# Altium integrated library BYTECH_HW_LIB_2019.IntLib: 907 symbols (part 2 of 6) (continued)
## Quectel M66 (continued)
text: M66 OPEN CPU

## Quectel M66_R2
designator U?, comment M66_R2
GSM MODULE OPEN CPU; MFR: Quectel; Solder: SMT; MPN: M66_R2; Value: M66_R2; Category: MODULE
footprint M66
pins: 1 AGND (power), 2 SPK2P, 3 MICP, 4 MICN, 5 SPK1P, 6 SPK1N, 7 PWRKEY, 8 AVDD, 9 ADC0, 10 SIM_GND (power), 11 SIM_DATA (io), 12 SIM_RST (out), 13 SIM_CLK (out), 14 SIM_VDD (out), 15 RFU, 16 NETLIGHT/GPIO/PWM, 17 TXD (out), 18 RXD (in), 19 DTR/GPIO/EINT, 20 RI/GPIO/I2C_SCL, 21 DCD/GPIO/I2C_SDA, 22 CTS/GPIO, 23 RTS/GPIO, 24 VDD_EXT (out), 25 RFTXMON, 26 RFU, 27 GND, 28 RXD_AUX/GPIO, 29 TXD_AUX/GPIO, 30 PCM_CLK/GPIO/SPI_CS, 31 PCM_SYNC/GPIO/SPI_MISO, 32 PCM_IN/GPIOSPI_CLK, 33 PCM_OUT/GPIO/SPI_MOSI, 34 GND, 35 RF_ANT (io), 36 GND (power), 37 GND (power), 38 DBG_RXD (in), 39 DBG_TXD (out), 40 GND (power), 41 GND (power), 42 VBAT (in), 43 VBAT (in), 44 VRTC (io)
text: M66 OPEN CPU

## Quectel M95FA
designator U?, comment M95FA
Quectel GSM & GPRS Module; Solder: SMT; MPN: M95FA; Value: M95FA; Category: MODULE
footprint M95FA
pins: 1 AGND (power), 2 MIC2P (in), 3 MIC2N (in), 4 MIC1P (in), 5 MIC1N (in), 6 SPK1N (out), 7 SPK1P (out), 8 LOUDSPKN (out), 9 LOUDSPKP (out), 10 PWRKEY (in), 11 EMERG_OFF (in), 12 STATUS (out), 13 NETLIGHT (out), 14 DBG_RXD (in), 15 DBG_TXD (out), 19 VDD_EXT (out), 20 DTR (in), 21 RXD (in), 22 TXD (out), 23 CTS (out), 24 RTS (in), 25 DCD (out), 26 RI (in), 27 SIM_VDD (out), 28 SIM_RST (out), 29 SIM_DATA (io), 30 SIM_CLK (out), 31 SIM_GND (power), 32 VRTC (io), 33 VBAT (in), 34 VBAT (in), 35 GND (power), 36 GND (power), 37 GND (power), 38 GND (power), 39 RF_ANT (io), 40 GND (power), 41 RESERVED (io) hidden, 42 RESERVED (io) hidden
text: M95 - Quectel; GSM/GPRS MODULE

## Quectel MC60
designator U?, comment MC60
GSM GNSS Module; Solder: SMT; MPN: MC60; Value: MC60; Category: MODULE
footprint MC60
pins: 1 MICP, 2 MICN, 3 SPKP, 4 SPKN, 5 PWRKEY (in), 6 ADC (in), 7 SD_CMD/GPIO (io), 8 SD_CLK/GPIO (io), 9 SD_DATA/GPIO (io), 10 SIM2_CLK/GPIO (out), 11 SIM2_DATA/GPIO (io), 12 SIM2_RST/GPIO (out), 13 SIM2_VDD (power), 14 GND (power), 15 GNSS_ANT, 16 SIM_GND (power), 18 SIM1_VDD (power), 19 SIM1_CLK (out), 20 SIM1_RST (out), 21 SIM1_DATA (io), 22 GNSS_TXD (out), 23 GNSS_RXD (in), 24 RXD_AUX (in), 25 TXD_AUX (out), 26 GNSS_VCC (power), 27 GND (power), 28 GNSS_VCC_EN (out), 29 DBG_TXD (out), 30 DBG_RXD (in), 31 GND (power), 32 BT_ANT, 33 TXD (out), 34 RXD (in), 35 RI/I2C_SCL (io), 36 DCD/I2C_SDA (io), 37 DTR/GPIO/EINT (io), 38 CTS/GPIO/EINT (io), 39 RTS/GPIO (io), 40 GND (power), 41 RF_ANT, 42 GND (power), 43 VDD_EXT, 44 GND (power), 45 GND (power), 47 NETLIGHT/GPIO (io), 48 GND (power), 49 GND (power), 50 VBAT (power), 51 VBAT (power), 52 VRTC (power), 53 LOUDSPKN, 54 LOUDSPKP, 59 PCM_CLK/SPI_CS (io), 60 PCM_OUT/SPI_MOSI (io), 61 PCM_SYNC/SPI_MISO (io), 62 PCM_IN/SPI_CLK (io)

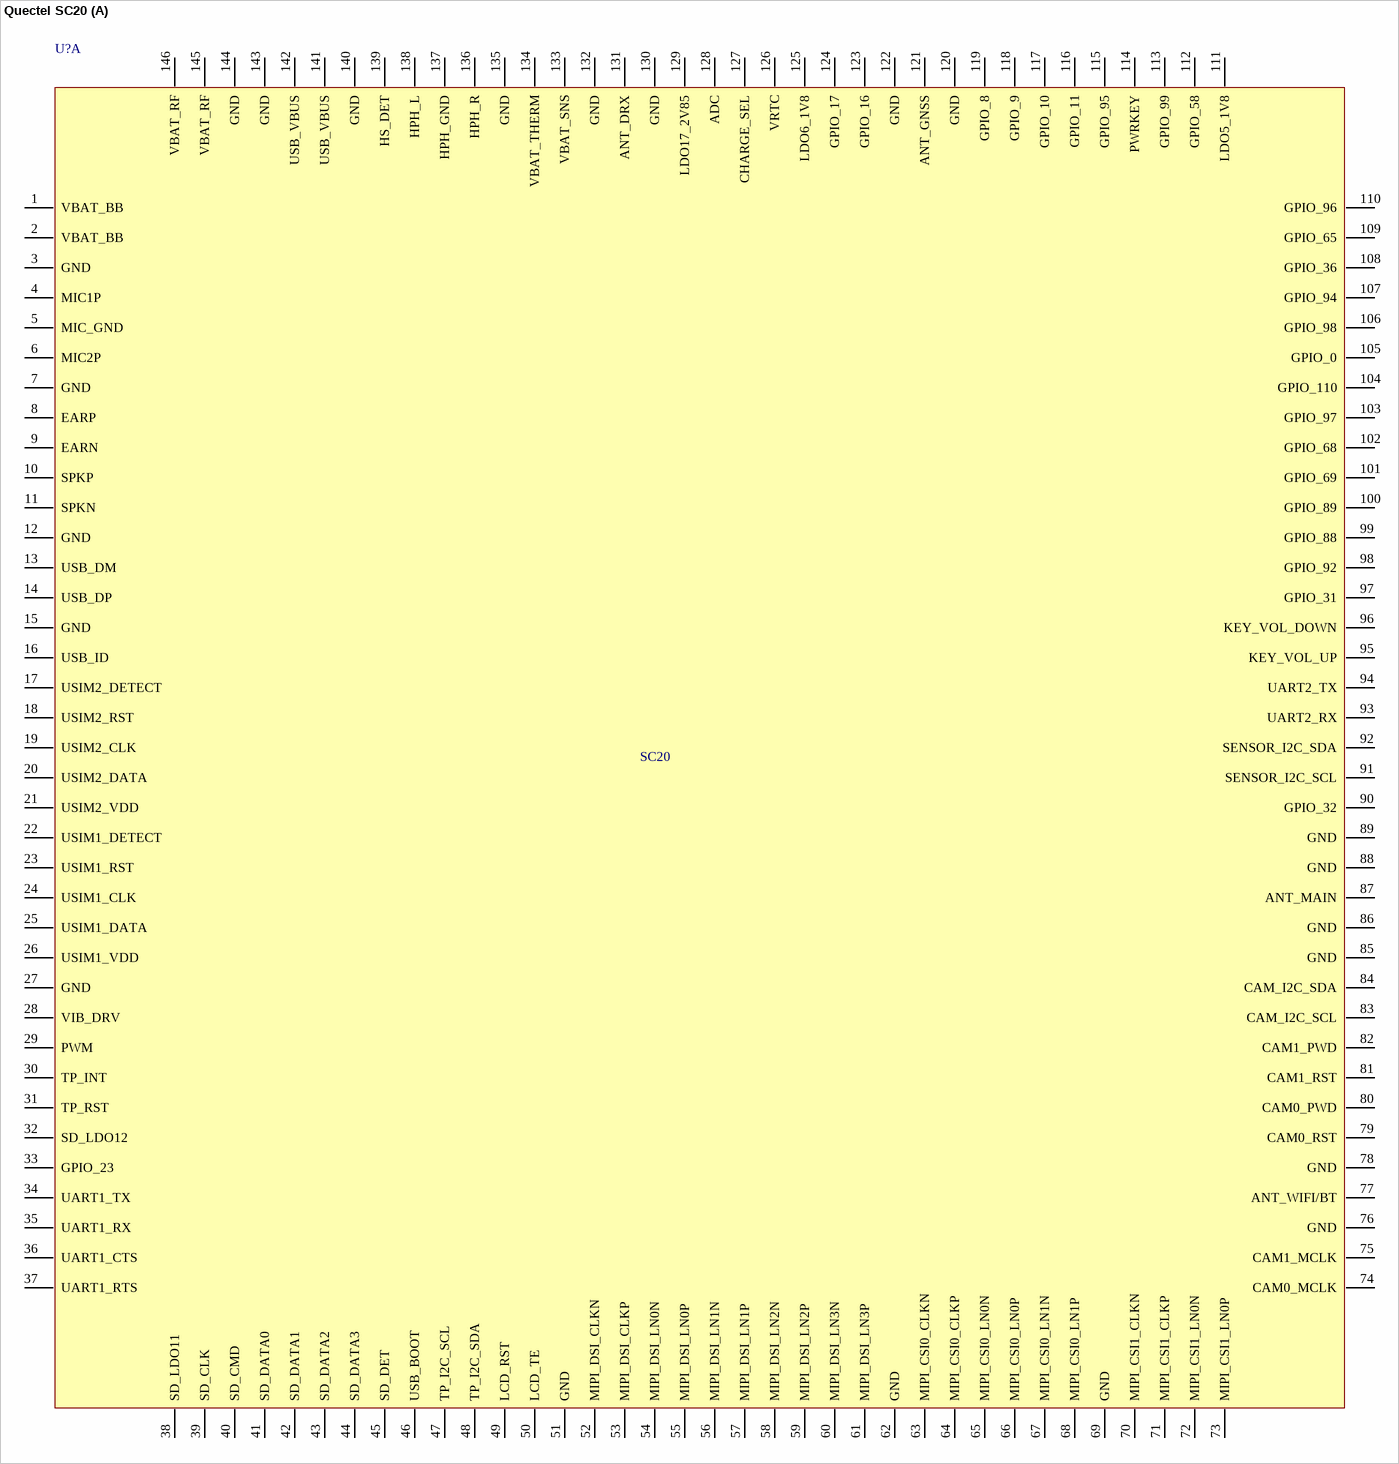
[diagram p10: symbol Quectel SC20]

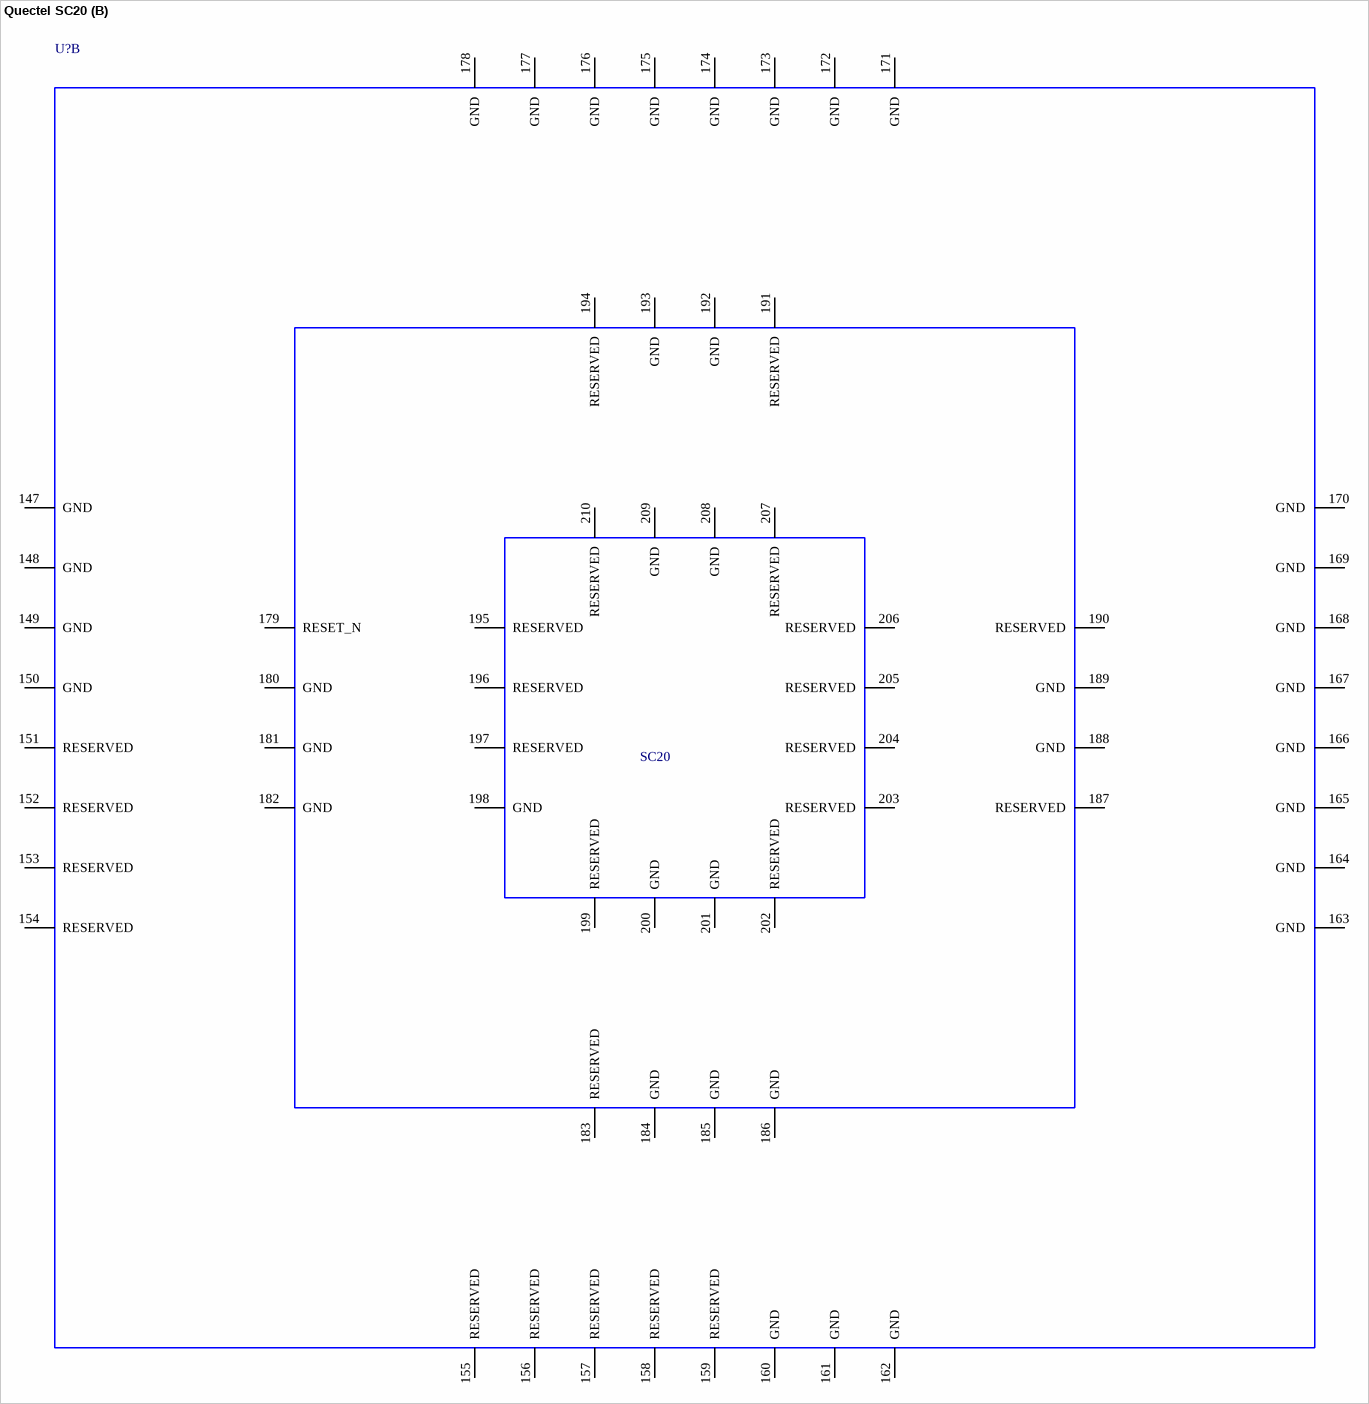
[diagram p11: symbol Quectel SC20]

## Quectel SC20
designator U?, comment SC20
Value: SC20A; Solder: SMT; MPN: SC20A; Category: MODULE
part A pins: 1 VBAT_BB, 2 VBAT_BB, 3 GND, 4 MIC1P, 5 MIC_GND, 6 MIC2P, 7 GND, 8 EARP, 9 EARN, 10 SPKP, 11 SPKN, 12 GND, 13 USB_DM, 14 USB_DP, 15 GND, 16 USB_ID, 17 USIM2_DETECT, 18 USIM2_RST, 19 USIM2_CLK, 20 USIM2_DATA, 21 USIM2_VDD, 22 USIM1_DETECT, 23 USIM1_RST, 24 USIM1_CLK, 25 USIM1_DATA, 26 USIM1_VDD, 27 GND, 28 VIB_DRV, 29 PWM, 30 TP_INT, 31 TP_RST, 32 SD_LDO12, 33 GPIO_23, 34 UART1_TX, 35 UART1_RX, 36 UART1_CTS, 37 UART1_RTS, 38 SD_LDO11, 39 SD_CLK, 40 SD_CMD, 41 SD_DATA0, 42 SD_DATA1, 43 SD_DATA2, 44 SD_DATA3, 45 SD_DET, 46 USB_BOOT, 47 TP_I2C_SCL, 48 TP_I2C_SDA, 49 LCD_RST, 50 LCD_TE, 51 GND, 52 MIPI_DSI_CLKN, 53 MIPI_DSI_CLKP, 54 MIPI_DSI_LN0N, 55 MIPI_DSI_LN0P, 56 MIPI_DSI_LN1N, 57 MIPI_DSI_LN1P, 58 MIPI_DSI_LN2N, 59 MIPI_DSI_LN2P, 60 MIPI_DSI_LN3N, 61 MIPI_DSI_LN3P, 62 GND, 63 MIPI_CSI0_CLKN, 64 MIPI_CSI0_CLKP, 65 MIPI_CSI0_LN0N, 66 MIPI_CSI0_LN0P, 67 MIPI_CSI0_LN1N, 68 MIPI_CSI0_LN1P, 69 GND, 70 MIPI_CSI1_CLKN, 71 MIPI_CSI1_CLKP, 72 MIPI_CSI1_LN0N, 73 MIPI_CSI1_LN0P, 74 CAM0_MCLK, 75 CAM1_MCLK, 76 GND, 77 ANT_WIFI/BT, 78 GND, 79 CAM0_RST, 80 CAM0_PWD, 81 CAM1_RST, 82 CAM1_PWD, 83 CAM_I2C_SCL, 84 CAM_I2C_SDA, 85 GND, 86 GND, 87 ANT_MAIN, 88 GND, 89 GND, 90 GPIO_32, 91 SENSOR_I2C_SCL, 92 SENSOR_I2C_SDA, 93 UART2_RX, 94 UART2_TX, 95 KEY_VOL_UP, 96 KEY_VOL_DOWN, 97 GPIO_31, 98 GPIO_92, 99 GPIO_88, 100 GPIO_89, 101 GPIO_69, 102 GPIO_68, 103 GPIO_97, 104 GPIO_110, 105 GPIO_0, 106 GPIO_98, 107 GPIO_94, 108 GPIO_36, 109 GPIO_65, 110 GPIO_96, 111 LDO5_1V8, 112 GPIO_58, 113 GPIO_99, 114 PWRKEY, 115 GPIO_95, 116 GPIO_11, 117 GPIO_10, 118 GPIO_9, 119 GPIO_8, 120 GND, 121 ANT_GNSS, 122 GND, 123 GPIO_16, 124 GPIO_17, 125 LDO6_1V8, 126 VRTC, 127 CHARGE_SEL, 128 ADC, 129 LDO17_2V85, 130 GND, 131 ANT_DRX, 132 GND, 133 VBAT_SNS, 134 VBAT_THERM, 135 GND, 136 HPH_R, 137 HPH_GND, 138 HPH_L, 139 HS_DET, 140 GND, 141 USB_VBUS, 142 USB_VBUS, 143 GND, 144 GND, 145 VBAT_RF, 146 VBAT_RF
part B pins: 147 GND, 148 GND, 149 GND, 150 GND, 151 RESERVED, 152 RESERVED, 153 RESERVED, 154 RESERVED, 155 RESERVED, 156 RESERVED, 157 RESERVED, 158 RESERVED, 159 RESERVED, 160 GND, 161 GND, 162 GND, 163 GND, 164 GND, 165 GND, 166 GND, 167 GND, 168 GND, 169 GND, 170 GND, 171 GND, 172 GND, 173 GND, 174 GND, 175 GND, 176 GND, 177 GND, 178 GND, 179 RESET_N, 180 GND, 181 GND, 182 GND, 183 RESERVED, 184 GND, 185 GND, 186 GND, 187 RESERVED, 188 GND, 189 GND, 190 RESERVED, 191 RESERVED, 192 GND, 193 GND, 194 RESERVED, 195 RESERVED, 196 RESERVED, 197 RESERVED, 198 GND, 199 RESERVED, 200 GND, 201 GND, 202 RESERVED, 203 RESERVED, 204 RESERVED, 205 RESERVED, 206 RESERVED, 207 RESERVED, 208 GND, 209 GND, 210 RESERVED

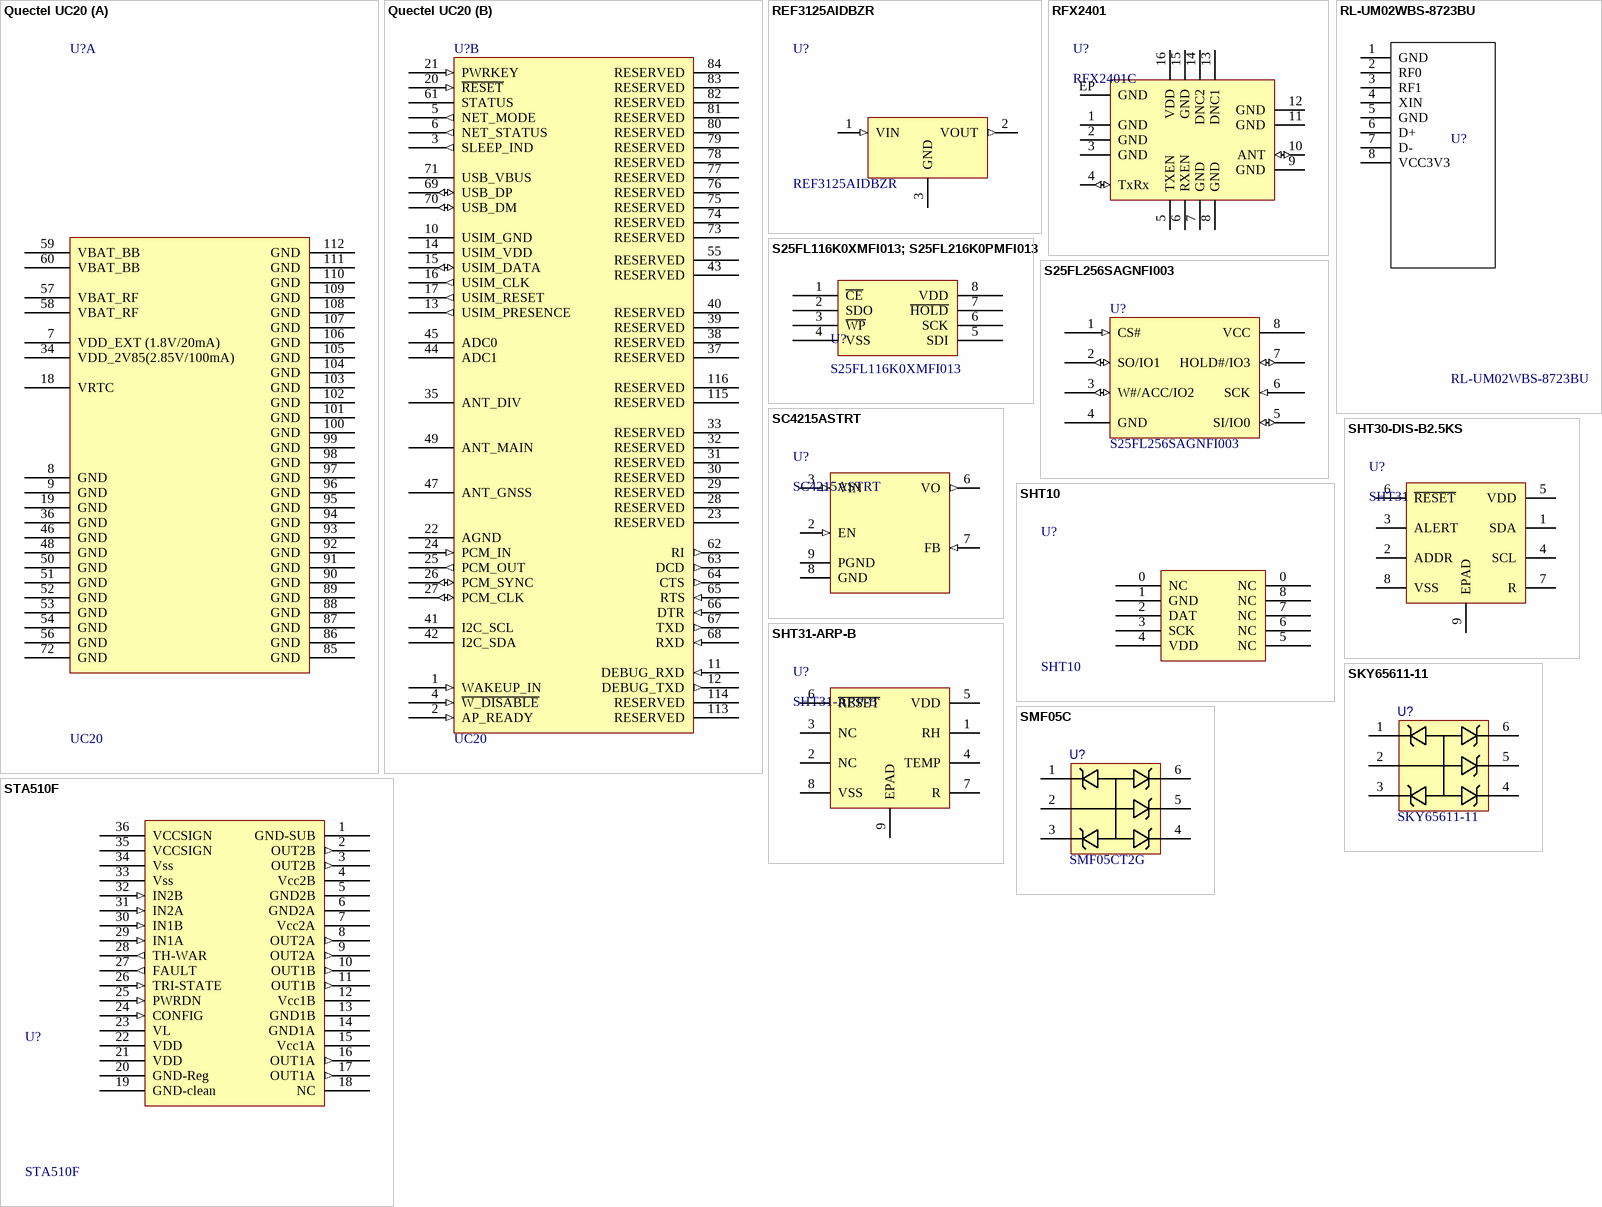
[diagram p12: symbols Quectel UC20 to STA510F]

## Quectel UC20
designator U?, comment UC20
Value: UC20A; Solder: SMT; MPN: UC20A; Category: MODULE
footprint QUECTEL_UC20 (Footprint not found)
part A pins: 7 VDD_EXT (1.8V/20mA) (power), 8 GND (power), 9 GND (power), 18 VRTC (power), 19 GND (power), 34 VDD_2V85(2.85V/100mA) (power), 36 GND (power), 46 GND (power), 48 GND (power), 50 GND (power), 51 GND (power), 52 GND (power), 53 GND (power), 54 GND (power), 56 GND (power), 57 VBAT_RF (power), 58 VBAT_RF (power), 59 VBAT_BB (power), 60 VBAT_BB (power), 72 GND (power), 85 GND (power), 86 GND (power), 87 GND (power), 88 GND (power), 89 GND (power), 90 GND (power), 91 GND (power), 92 GND (power), 93 GND (power), 94 GND (power), 95 GND (power), 96 GND (power), 97 GND (power), 98 GND (power), 99 GND (power), 100 GND (power), 101 GND (power), 102 GND (power), 103 GND (power), 104 GND (power), 105 GND (power), 106 GND (power), 107 GND (power), 108 GND (power), 109 GND (power), 110 GND (power), 111 GND (power), 112 GND (power)
part B pins: 1 WAKEUP_IN (in), 2 AP_READY (in), 3 SLEEP_IND (out), 4 ~{W_DISABLE} (in), 5 NET_MODE (out), 6 NET_STATUS (out), 10 USIM_GND (power), 11 DEBUG_RXD (in), 12 DEBUG_TXD (out), 13 USIM_PRESENCE (out), 14 USIM_VDD (power), 15 USIM_DATA (io), 16 USIM_CLK (out), 17 USIM_RESET (out), 20 ~{RESET} (in), 21 PWRKEY (in), 22 AGND (power), 23 RESERVED, 24 PCM_IN (in), 25 PCM_OUT (out), 26 PCM_SYNC (io), 27 PCM_CLK (io), 28 RESERVED, 29 RESERVED, 30 RESERVED, 31 RESERVED, 32 RESERVED, 33 RESERVED, 35 ANT_DIV, 37 RESERVED, 38 RESERVED, 39 RESERVED, 40 RESERVED, 41 I2C_SCL (oe), 42 I2C_SDA (oe), 43 RESERVED, 44 ADC1 (hiz) "0.2V-4.2V", 45 ADC0 (hiz) "0.2V-2.1V", 47 ANT_GNSS, 49 ANT_MAIN, 55 RESERVED, 61 STATUS (oe), 62 RI (out), 63 DCD (out), 64 CTS (out), 65 RTS (in), 66 DTR (in), 67 TXD (out), 68 RXD (in), 69 USB_DP (io), 70 USB_DM (io), 71 USB_VBUS (power), 73 RESERVED, 74 RESERVED, 75 RESERVED, 76 RESERVED, 77 RESERVED, 78 RESERVED, 79 RESERVED, 80 RESERVED, 81 RESERVED, 82 RESERVED, 83 RESERVED, 84 RESERVED, 113 RESERVED, 114 RESERVED, 115 RESERVED, 116 RESERVED

## REF3125AIDBZR
designator U?
IC VREF SERIES 0.2% SOT23-3; MFR: Texas Instruments; Solder: SMT; MPN: REF3125AIDBZR; Value: REF3125AIDBZR; Category: IC; PinCount: 3
footprint SOT23_3 (SOT23, 3-Leads, Body 2,90x2,30mm, Pitch 0,95mm, IPC Medium Density)
pins: 1 VIN (in), 2 VOUT (out), 3 GND

## RFX2401
designator U?, comment RFX2401C
2.4 GHz ZigBee®/ISM Front-End Module; Brand: SkyWork; Name VNET: VT_IC_RFX2401C; Part Number: RFX2401C
footprint QFN16 30X30 (QFN, 16-Leads, Body 3.00x3.00mm, Pitch 0.50mm, Thermal Pad 1.70x1.70mm, IPC Medium Density)
pins: 1 GND, 2 GND, 3 GND, 4 TxRx (io), 5 TXEN (power), 6 RXEN (power), 7 GND (power), 8 GND (power), 9 GND (power), 10 ANT (io), 11 GND, 12 GND, 13 DNC1, 14 DNC2, 15 GND, 16 VDD, EP GND (power)

## RL-UM02WBS-8723BU
designator U?
IEEE 802.11b/g/n  1T1R WLAN and Bluetooth; Solder: SMT; MPN: RL-UM02WBS-8723BU; Value: RL-UM02WBS-8723BU; Category: IC
footprint RL-UM02WBS-8723BU
pins: 1 GND, 2 RF0, 3 RF1, 4 XIN, 5 GND, 6 D+, 7 D-, 8 VCC3V3

## S25FL116K0XMFI013; S25FL216K0PMFI013
designator U?, comment S25FL116K0XMFI013
Flash Memory 16Mb 3V 65MHz Serial NOR Flash; MPN: S25FL116K0XMFI013; S25FL216K0PMFI013; Solder: SMT; Value: S25FL116K0XMFI013; Category: IC
pins: 1 ~{CE}, 2 SDO, 3 ~{WP}, 4 VSS (power), 5 SDI, 6 SCK, 7 ~{HOLD}, 8 VDD (power)

## S25FL256SAGNFI003
designator U?
IC FLASH 256MBIT 133MHZ 8WSON; Solder: SMT; MPN: S25FL256SAGNFI003; Value: S25FL256SAGNFI003; Category: IC
footprint WSON-8 (6x8mm)
pins: 1 CS# (in), 2 SO/IO1 (io), 3 W#/ACC/IO2 (io), 4 GND (power), 5 SI/IO0 (io), 6 SCK (in), 7 HOLD#/IO3 (io), 8 VCC (power)

## SC4215ASTRT
designator U?
IC REG LINEAR POS ADJ 2A 8SOIC; MFR: Semtech Corporation; Solder: SMT; MPN: SC4215ASTRT; Value: SC4215ASTRT; Category: IC
footprint SOIC-8-TP (SOIC 8 pin with Thermal Pad)
pins: 2 EN (in), 3 VIN (in), 6 VO (out), 7 FB (in), 8 GND, 9 TP hidden to PGND, 9 PGND

## SHT10
designator U?
Humidity and Temperature Sensor IC; MFR: Sensirion; Solder: SMT; MPN: SHT10; Value: SHT10; Category: IC; PinCount: 10
footprint SHT10/11/15 (Footprint not found)
pins: 0 NC, 0 NC, 1 GND, 2 DAT, 3 SCK, 4 VDD, 5 NC, 6 NC, 7 NC, 8 NC

## SHT30-DIS-B2.5KS
designator U?, comment SHT31
SENSOR HUMID/TEMP 5V I2C 3% SMD; MPN: SHT30-DIS-B2.5KS; MFR: Sensirion AG
footprint SHT3x
pins: 1 SDA, 2 ADDR, 3 ALERT, 4 SCL, 5 VDD, 6 ~{RESET}, 7 R, 8 VSS, 9 EPAD

## SHT31-ARP-B
designator U?
SENSOR HUMID/TEMP 5V ANLG 2% SMD; MFR: Sensirion AG; MPN: SHT31-ARP-B
footprint SHT3x
pins: 1 RH, 2 NC, 3 NC, 4 TEMP, 5 VDD, 6 ~{RESET}, 7 R, 8 VSS, 9 EPAD

## SKY65611-11
designator U?
IC AMP GPS 1.559GHZ-1.61GHZ 6DFN; MFR: Skyworks Solutions Inc.; Solder: SMT; CompanyID: VT-0; MPN: SKY65611-11; Category: IC; Value: SKY65611-11; PinCount: 6
footprint SOT65P210X140-6N (SOT23, 6-Leads, Body 2.00x2.10mm, Pitch 0.65mm, IPC Medium Density)
pins: 1 CT1, 2 AN, 3 CT2, 4 CT3, 5 CT4, 6 CT5

## SMF05C
designator U?, comment SMF05CT2G
TVS Diode Array For ESD and Latch-Up Protection; MFR: ON SEMICONDUCTOR; Solder: SMT; CompanyID: VT-0; MPN: SMF05CT2G; Category: IC; Value: SMF05CT2G
footprint SOT65P210X140-6N (SOT23, 6-Leads, Body 2.00x2.10mm, Pitch 0.65mm, IPC Medium Density)
pins: 1 CT1, 2 AN, 3 CT2, 4 CT3, 5 CT4, 6 CT5

## STA510F
designator U?
IC AMP D MONO/STER 200W PWRSO-36; MFR: STMicroelectronics; Solder: SMT; MPN: STA510F; Value: STA510F; Category: IC
footprint SSOP50P1030X247_HS-37M (SSOP, 36-Leads, Body 10.30x7.50mm, Pitch 0.50mm, Thermal Pad 7.10x4.70mm, IPC Low Density)
pins: 1 GND-SUB (power) "Substrate ground", 2 OUT2B (out) "Output half-bridge 2B", 3 OUT2B (out) "Output half-bridge 2B", 4 Vcc2B (power) "Positive supply", 5 GND2B (power) "Negative supply", 6 GND2A (power) "Negative supply", 7 Vcc2A (power) "Positive supply", 8 OUT2A (out) "Output half-bridge 2A", 9 OUT2A (out) "Output half-bridge 2A", 10 OUT1B (out) "Output half-bridge 1B", 11 OUT1B (out) "Output half-bridge 1B", 12 Vcc1B (power) "Positive supply", 13 GND1B (power) "Negative supply", 14 GND1A (power) "Negative supply", 15 Vcc1A (power) "Positive supply", 16 OUT1A (out) "Output half-bridge 1A", 17 OUT1A (out) "Output half-bridge 1A", 18 NC "Not connected", 19 GND-clean (power) "Logical ground", 20 GND-Reg (power) "Ground for regulator Vdd", 21 VDD (power) "5-V regulator referred to ground", 22 VDD (power) "5-V regulator referred to ground", 23 VL (power) "High logical state setting voltage", 24 CONFIG (in) "Configuration", 25 PWRDN (in) "Standby", 26 TRI-STATE (in) "Hi-Z", 27 FAULT (out) "Fault pin advisor", 28 TH-WAR (out) "Thermal warning advisor", 29 IN1A (in) "Input of half-bridge 1A", 30 IN1B (in) "Input of half-bridge 1B", 31 IN2A (in) "Input of half-bridge 2A", 32 IN2B (in) "Input of half-bridge 2B", 33 Vss (power) "5-V regulator referred to +VCC", 34 Vss (power) "5-V regulator referred to +VCC", 35 VCCSIGN (power) "Signal positive supply", 36 VCCSIGN (power) "Signal positive supply"

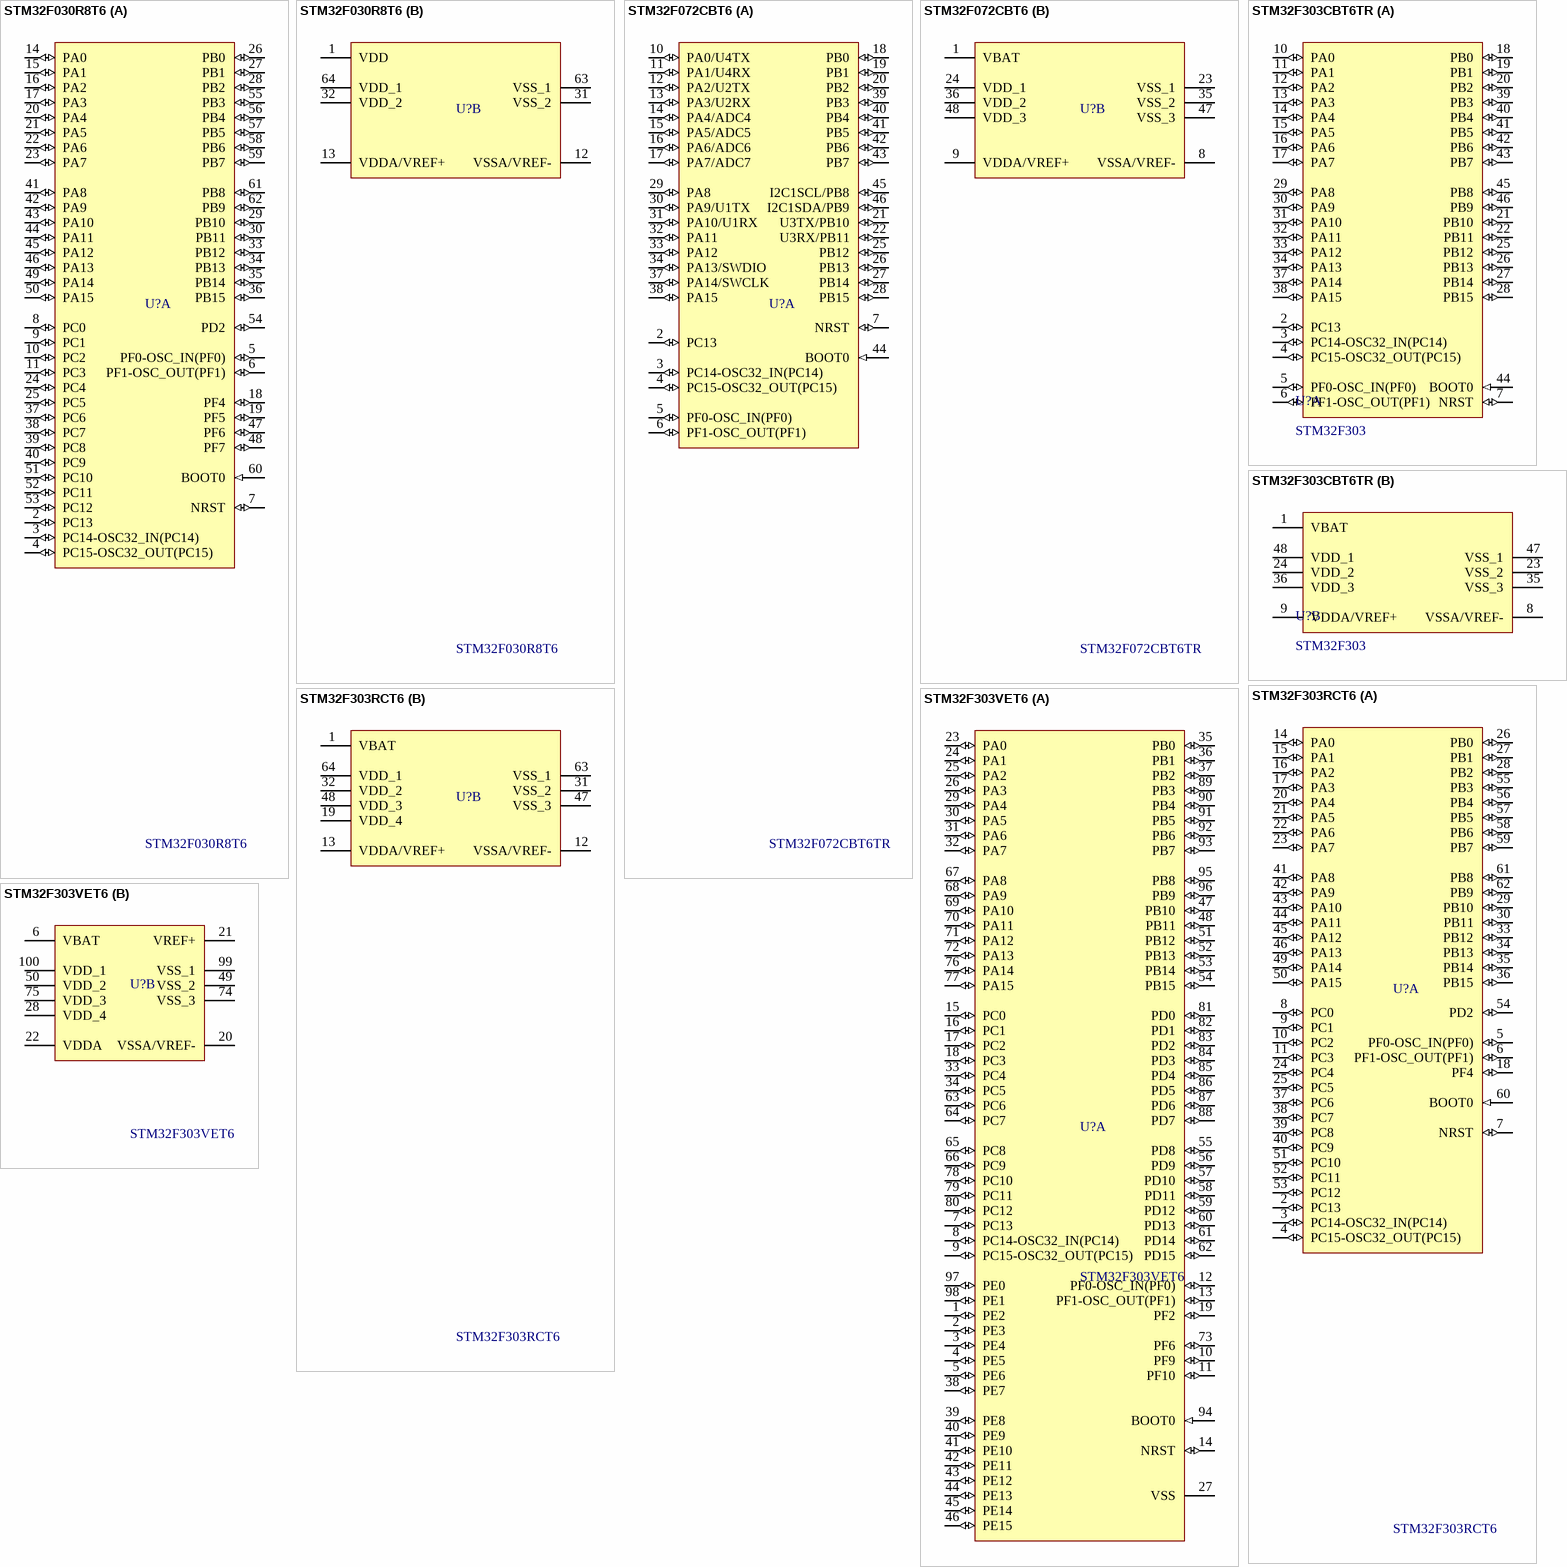
[diagram p13: symbols STM32F030R8T6 to STM32F303VET6]

## STM32F030R8T6
designator U?
IC MCU 32BIT 64KB FLASH 64LQFP; MPN: STM32F030R8T6TR; Solder: SMT; Value: STM32F030R8T6; Category: IC
footprint LQFP-64 (Low Profile Quad Flat Pack (LQFP), 0.50 mm pitch; square, 16 pin X 16 pin, 10.00 mm L X 10.00 mm W X 1.60 mm H body)
part A pins: 2 PC13 (io) "PC13/TIM1_CH1N/WKUP2,RTC_TAMP1,RTC_TS,RTC_OUT", 3 PC14-OSC32_IN(PC14) (io) "PC14-OSC32_IN(PC14)/OSC32_IN", 4 PC15-OSC32_OUT(PC15) (io) "PC15-OSC32_OUT(PC15)/OSC32_OUT", 5 PF0-OSC_IN(PF0) (io) "PF0-OSC_IN(PF0)/TIM1_CH3N,I2C2_SDA/OSC_IN", 6 PF1-OSC_OUT(PF1) (io) "PF1-OSC_OUT(PF1)/I2C2_SCL/OSC_OUT", 7 NRST (io) "Device reset input / internal reset output (active low)", 8 PC0 (io) "PC0/EVENTOUT/ADC12_IN6,COMP7_INM", 9 PC1 (io) "PC1/EVENTOUT/ADC12_IN7,COMP7_INP", 10 PC2 (io) "PC2/COMP7_OUT,EVENTOUT/ADC12_IN8", 11 PC3 (io) "PC3/TIM1_BKIN2,EVENTOUT/ADC12_IN9", 14 PA0 (io) "PA0/USART2_CTS,TIM2_CH1_ETR,TIM8_BKIN,TIM8_ETR,TSC_G1_IO1,COMP1_OUT,EVENTOUT/ADC1_IN1,COMP1_INM,RTC_TAMP2,WKUP1,COMP7_INP", 15 PA1 (io) "PA1/USART2_RTS,TIM2_CH2,TSC_G1_IO2,TIM15_CH1N,RTC_REFIN,EVENTOUT/ADC1_IN2,COMP1_INP,OPAMP1_VINP,OPAMP3_VINP", 16 PA2 (io) "PA2/USART2_TX,TIM2_CH3,TIM15_CH1,TSC_G1_IO3,COMP2_OUT,EVENTOUT/ADC1_IN3,COMP2_INM,OPAMP1_VOUT", 17 PA3 (io) "PA3/USART2_RX,TIM2_CH4,TIM15_CH2,TSC_G1_IO4,EVENTOUT/ADC1_IN4,OPAMP1_VINP,COMP2_INP,OPAMP1_VINM", 18 PF4 (io) "PF4/COMP1_OUT,EVENTOUT/ADC1_IN5", 19 PF5 (io) "PF4/COMP1_OUT,EVENTOUT/ADC1_IN5", 20 PA4 (io) "PA4/SPI1_NSS,SPI3_NSS,I2S3_WS,USART2_CK,TSC_G2_IO1,TIM3_CH2,EVENTOUT/ADC2_IN1,DAC1_OUT1,OPAMP4_VINP,COMP1_INM,COMP2_INM,COMP3_INM,COMP4_INM,COMP5_INM,COMP6_INM,COMP7_INM", 21 PA5 (io) "PA5/SPI1_SCK,TIM2_CH1_ETR,TSC_G2_IO2,EVENTOUT/ADC2_IN2,DAC1_OUT2,OPAMP1_VINP,OPAMP2_VINM,OPAMP3_VINP,COMP1_INM,COMP2_INM,COMP3_INM,COMP4_INM,COMP5_INM,COMP6_INM,COMP7_INM", 22 PA6 (io) "PA6/SPI1_MISO,TIM3_CH1,TIM8_BKIN,TIM1_BKIN,TIM16_CH1,COMP1_OUT,TSC_G2_IO3,EVENTOUT/ADC2_IN3,OPAMP2_VOUT", 23 PA7 (io) "PA7/SPI1_MOSI,TIM3_CH2,TIM17_CH1,TIM1_CH1N,TIM8_CH1N,TSC_G2_IO4,COMP2_OUT,EVENTOUT/ADC2_IN4,COMP2_INP,OPAMP2_VINP,OPAMP1_VINP", 24 PC4 (io) "PC4/USART1_TX,EVENTOUT/ADC2_IN5", 25 PC5 (io) "PC5/USART1_RX,TSC_G3_IO1,EVENTOUT/ADC2_IN11,OPAMP2_VINM,OPAMP1_VINM", 26 PB0 (io) "PB0/TIM3_CH3,TIM1_CH2N,TIM8_CH2N,TSC_G3_IO2,EVENTOUT/ADC3_IN12,COMP4_INP,OPAMP3_VINP,OPAMP2_VINP", 27 PB1 (io) "PB1/TIM3_CH4,TIM1_CH3N,TIM8_CH3N,COMP4_OUT,TSC_G3_IO3,EVENTOUT/ADC3_IN1,OPAMP3_VOUT", 28 PB2 (io) "PB2/TSC_G3_IO4,EVENTOUT/ADC2_IN12,COMP4_INM,OPAMP3_VINM", 29 PB10 (io) "PB10/USART3_TX,TIM2_CH3,TSC_SYNC,EVENTOUT/COMP5_INM,OPAMP4_VINM,OPAMP3_VINM", 30 PB11 (io) "PB11/USART3_RX,TIM2_CH4,TSC_G6_IO1,EVENTOUT/COMP6_INP,OPAMP4_VINP", 33 PB12 (io) "PB12/SPI2_NSS,I2S2_WS,I2C2_SMBA,USART3_CK,TIM1_BKIN,TSC_G6_IO2,EVENTOUT/ADC4_IN3,COMP3_INM,OPAMP4_VOUT", 34 PB13 (io) "PB13/SPI2_SCK,I2S2_CK,USART3_CTS,TIM1_CH1N,TSC_G6_IO3,EVENTOUT/ADC3_IN5,COMP5_INP,OPAMP4_VINP,OPAMP3_VINP", 35 PB14 (io) "PB14/SPI2_MISO,I2S2ext_SD,USART3_RTS,TIM1_CH2N,TIM15_CH1,TSC_G6_IO4,EVENTOUT/COMP3_INP,ADC4_IN4,OPAMP2_VINP", 36 PB15 (io) "PB15/SPI2_MOSI,I2S2_SD,TIM1_CH3N,RTC_REFIN,TIM15_CH1N,TIM15_CH2,EVENTOUT/ADC4_IN5,COMP6_INM", 37 PC6 (io) "PC6/I2S2_MCK,COMP6_OUT,TIM8_CH1,TIM3_CH1,EVENTOUT", 38 PC7 (io) "PC7/I2S3_MCK,TIM8_CH2,TIM3_CH2,COMP5_OUT,EVENTOUT", 39 PC8 (io) "PC8/TIM8_CH3,TIM3_CH3,COMP3_OUT,EVENTOUT", 40 PC9 (io) "PC9/TIM8_CH4,TIM8_BKIN2,TIM3_CH4,I2S_CKIN,EVENTOUT", 41 PA8 (io) "PA8/I2C2_SMBA,I2S2_MCK,USART1_CK,TIM1_CH1,TIM4_ETR,MCO,COMP3_OUT,EVENTOUT", 42 PA9 (io) "PA9/I2C2_SCL,I2S3_MCK,USART1_TX,TIM1_CH2,TIM2_CH3,TIM15_BKIN,TSC_G4_IO1,COMP5_OUT,EVENTOUT", 43 PA10 (io) "PA10/I2C2_SDA,USART1_RX,TIM1_CH3,TIM2_CH4,TIM8_BKIN,TIM17_BKIN,TSC_G4_IO2,COMP6_OUT,EVENTOUT", 44 PA11 (io) "PA11/USART1_CTS,USB_DM,CAN_RX,TIM1_CH1N,TIM1_CH4,TIM1_BKIN2,TIM4_CH1,COMP1_OUT,EVENTOUT", 45 PA12 (io) "PA12/USART1_RTS,USB_DP,CAN_TX,TIM1_CH2N,TIM1_ETR,TIM4_CH2,TIM16_CH1,COMP2_OUT,EVENTOUT", 46 PA13 (io) "PA13/USART3_CTS,TIM4_CH3,TIM16_CH1N,TSC_G4_IO3,IR_OUT,SWDIO-JTMS,EVENTOUT", 47 PF6 (io) "PF4/COMP1_OUT,EVENTOUT/ADC1_IN5", 48 PF7 (io) "PF4/COMP1_OUT,EVENTOUT/ADC1_IN5", 49 PA14 (io) "PA14/I2C1_SDA,USART2_TX,TIM8_CH2,TIM1_BKIN,TSC_G4_IO4,SWCLK-JTCK,EVENTOUT", 50 PA15 (io) "PA15/I2C1_SCL,SPI1_NSS,SPI3_NSS,I2S3_WS,JTDI,USART2_RX,TIM1_BKIN,TIM2_CH1_ETR,TIM8_CH1,EVENTOUT", 51 PC10 (io) "PC10/SPI3_SCK,I2S3_CK,USART3_TX,UART4_TX,TIM8_CH1N,EVENTOUT", 52 PC11 (io) "PC11/SPI3_MISO,I2S3ext_SD,USART3_RX,UART4_RX,TIM8_CH2N,EVENTOUT", 53 PC12 (io) "PC12/SPI3_MOSI,I2S3_SD,USART3_CK,UART5_TX,TIM8_CH3N,EVENTOUT", 54 PD2 (io) "PD2/UART5_RX,TIM3_ETR,TIM8_BKIN,EVENTOUT", 55 PB3 (io) "PB3/SPI3_SCK,I2S3_CK,SPI1_SCK,USART2_TX,TIM2_CH2,TIM3_ETR,TIM4_ETR,TIM8_CH1N,TSC_G5_IO1,JTDO-TRACESWO,EVENTOUT", 56 PB4 (io) "PB4/SPI3_MISO,I2S3ext_SD,SPI1_MISO,USART2_RX,TIM3_CH1,TIM16_CH1,TIM17_BKIN,TIM8_CH2N,TSC_G5_IO2,NJTRST,EVENTOUT", 57 PB5 (io) "PB5/SPI3_MOSI,SPI1_MOSI,I2S3_SD,I2C1_SMBA,USART2_CK,TIM16_BKIN,TIM3_CH2,TIM8_CH3N,TIM17_CH1,EVENTOUT", 58 PB6 (io) "PB6/I2C1_SCL,USART1_TX,TIM16_CH1N,TIM4_CH1,TIM8_CH1,TSC_G5_IO3,TIM8_ETR,TIM8_BKIN2,EVENTOUT", 59 PB7 (io) "PB7/I2C1_SDA,USART1_RX,TIM3_CH4,TIM4_CH2,TIM17_CH1N,TIM8_BKIN,TSC_G5_IO4,EVENTOUT", 60 BOOT0 (in) "Boot memory selection", 61 PB8 (io) "PB8/I2C1_SCL,CAN_RX,TIM16_CH1,TIM4_CH3,TIM8_CH2,TIM1_BKIN,TSC_SYNC,COMP1_OUT,EVENTOUT", 62 PB9 (io) "PB9/I2C1_SDA,CAN_TX,TIM17_CH1,TIM4_CH4,TIM8_CH3,IR_OUT,COMP2_OUT,EVENTOUT"